# Altium footprint library PCBLIB.PcbLib: 775 footprints (part 6 of 49)
Each footprint in its own frame and in the unit in brackets; x right, y up, seen from the top. Pads: shape width x height; smd on the part's side, far side on the other; paste and mask are expansions set on the pad; w line width, h text height; cw(c..) or ccw(c..) is an arc to the next point about the centre after c.
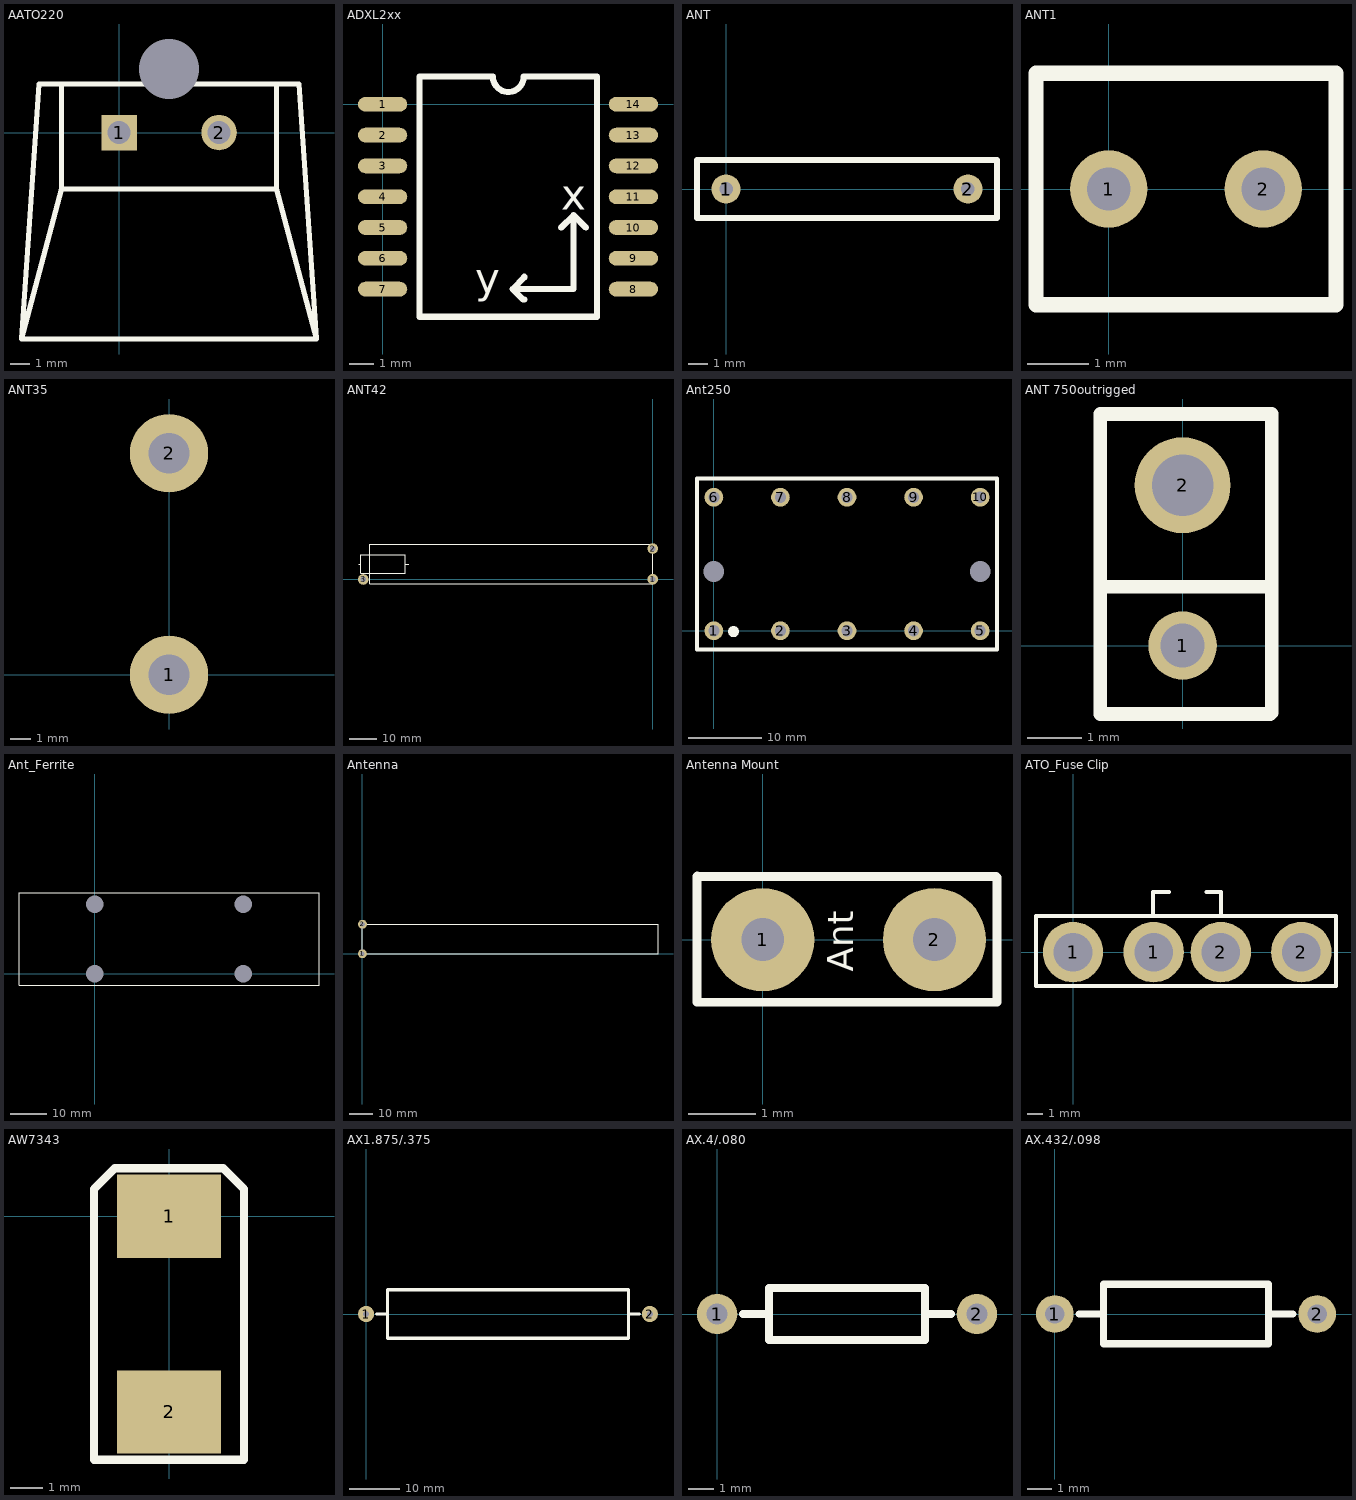
[diagram p5: the footprints below, top view; thin cyan lines are the x and y axes]

## AATO220 [mil]
pads (3):
  rect 71x71 hole 46: 1(0,0)
  round 71 hole 46: 2(200,0)
  round 0 hole 120 unplated: 3(100,127)
TopOverlay:
  lines w10: -115,97 -115,-113 ; 315,97 315,-113 ; -195,-413 -115,-113 ; -195,-413 -160,97 360,97 395,-413 ; -195,-413 395,-413 ; -115,-113 315,-113 ; 315,-113 395,-413
Mechanical4:
  text ".750" at 0,0 h1

## ADXL2xx [mil]
pads (14):
  oval 80x24 smd: 1(0,0) 2(0,-50) 3(0,-100) 4(0,-150) 5(0,-200) 6(0,-250) 7(0,-300) 8(407,-300) 9(407,-250) 10(407,-200) 11(407,-150) 12(407,-100) 13(407,-50) 14(407,0)
TopOverlay:
  lines w10: 178,45 60,45 60,-345 348,-345 348,45 229,45 cw(c204,45) 179,45 ; 230,-317 228,-317 211,-300 ; 230,-280 230,-281 211,-300 ; 290,-200 310,-180 ; 330,-200 310,-180 ; 211,-300 310,-300 310,-180
  text "y" at 150,-307 h50
  text "x" at 290,-171 h50
Mechanical4:
  text ".215" at 0,0 h1

## ANT [mil]
pads (2):
  round 60 hole 28: 1(0,0) 2(500,0)
TopOverlay:
  lines w12: -60,-60 -60,60 560,60 560,-60 -60,-60

## ANT1 [mil]
pads (2):
  round 50 hole 28: 1(0,0) 2(100,0)
TopOverlay:
  lines w10: -47,-75 -47,75 147,75 147,-75 -47,-75
Mechanical4:
  text ".005" at 0,0 h1

## ANT35 [mil]
pads (2):
  round 150 hole 78: 1(0,0) 2(0,425)

## ANT42 [mil]
pads (3):
  round 150 hole 78: 1(0,0) 2(0,434) 3(-4092,-3)
TopOverlay:
  lines w10: -4156,214 -4131,214 ; -3501,215 -3451,215 ; -4131,85 -4131,346 -3501,346 -3501,85 -4131,85 ; -4000,-65 0,-65 0,495 -4000,495 -4000,-65

## Ant250 [mil] "Antenna - 4 section"
height 900
pads (13):
  round 100 hole 60: 1(0,0) 2(355,0) 3(710,0) 4(1065,0) 5(1420,0) 6(0,712) 7(355,712) 8(710,712) 9(1065,712) 10(1420,712)
  round 10 hole 110 unplated: 11(0,316)
  round 10 hole 110: 12(1420,316)
  round 60 on Top Overlay: ""(104.83,-4.34)
TopOverlay:
  lines w20: -90,-100 1510,-100 1510,812 -90,812 -90,-100

## ANT 750outrigged [mil]
pads (2):
  round 50 hole 32: 1(0,0)
  round 70 hole 45: 2(0,117)
TopOverlay:
  lines w10: -58,43 65,43 ; -60,-50 -60,169 65,169 65,-49 64,-50 50,-50 -50,-50 -60,-50

## Ant_Ferrite [mil]
pads (4):
  round 70 hole 188: 0(0,0) 0(0,750) 0(1600,0) 0(1600,750)
TopOverlay:
  lines w8: -819,-125 525,-125 1145,-125 2419,-125 2419,875 -819,875 -819,-125

## Antenna [mil]
height 420
pads (2):
  round 150 hole 78: 1(0,0) 2(1,498)
TopOverlay:
  lines w10: 0,0 0,500 5000,500 5000,0 0,0

## Antenna Mount [mil]
pads (2):
  round 60 hole 25: 1(0,0) 2(100,0)
TopOverlay:
  lines w5: -38.28,-36.34 136.43,-36.34 136.43,36.44 136.08,36.8 -37.75,36.8 -38.11,37.15 -38.28,36.97 -38.28,28.67 -38.28,-36.34 ; -38.28,-36.34 -38.28,-36.34
  text "Ant" at 52.69,-18.68 h15
Mechanical4:
  text ".484" at 100,0 h1

## ATO_Fuse Clip [mil]
pads (4):
  round 150 hole 96: 1(0,0) 1(200,0) 2(367,0) 2(567,0)
TopOverlay:
  lines w10: 199,90 199,149 238,149 ; 331,149 367,149 367,90 ; -92,-84 653,-84 653,90 -92,90 -92,-84

## AW7343 [mil]
height 125
pads (2):
  rect 125x100 smd: 1(0,0) 2(0,-235)
TopOverlay:
  lines w10: -90,-292.5 90,-292.5 90,32.5 65,57.5 -65,57.5 -90,32.5 -90,-292.5

## AX1.875/.375 [mm]
pads (2):
  round 3.2 hole 1.194: 1(0,0) 2(55.88,0)
TopOverlay:
  lines w0.635: 2.032,0 4.146,0 ; 51.703,0 53.848,0 ; 4.191,-4.775 4.191,4.775 51.689,4.775 51.689,-4.775 4.191,-4.775

## AX.4/.080 [mil]
pads (2):
  round 62 hole 32: 1(0,0) 2(400,0)
TopOverlay:
  lines w12: 40,0 80,0 ; 320,0 360,0 ; 80,-40 320,-40 320,40 80,40 80,-40
Mechanical4:
  text ".040" at 0,0 h1

## AX.432/.098 [mil]
pads (2):
  round 62 hole 32: 1(0,0) 2(431,0)
TopOverlay:
  lines w12: 40,0 80,0 ; 351,0 391,0 ; 80,-49 351,-49 351,49 80,49 80,-49
Mechanical4:
  text ".040" at 0,0 h1